# Altium footprint library WIRELESS_SECURITYLib.PcbLib: 35 footprints (part 2 of 3)
Each footprint in its own frame and in the unit in brackets; x right, y up, seen from the top. Pads: shape width x height; smd on the part's side, far side on the other; paste and mask are expansions set on the pad; w line width, h text height; cw(c..) or ccw(c..) is an arc to the next point about the centre after c.
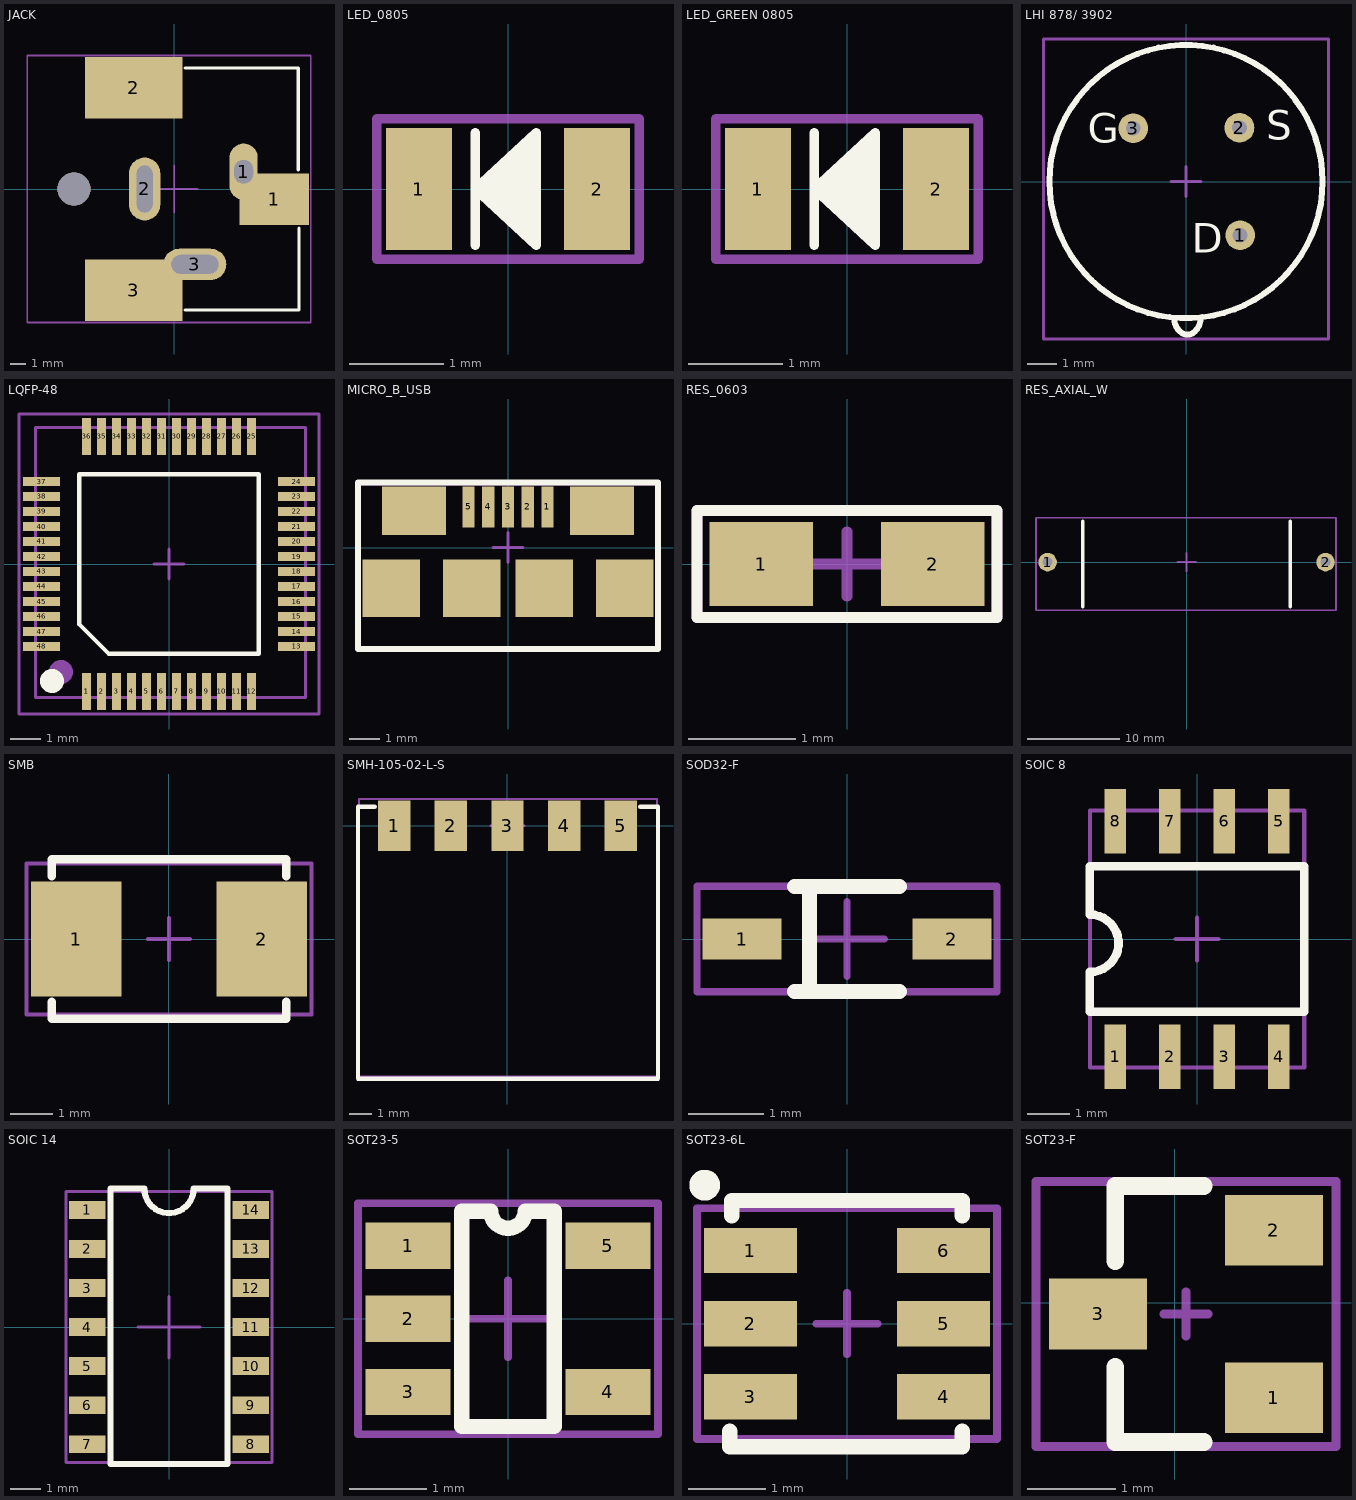
[diagram p1: the footprints below, top view; thin cyan lines are the x and y axes]

## JACK [mm]
pads (7):
  oval 1.8x3.6 hole 1.2 slot 1.5 at 90 deg: 1(4.425,1.1)
  rect 4.4x3.3 smd: 1(6.375,-0.65)
  rect 6.2x3.9 smd: 2(-2.575,6.45) 3(-2.575,-6.45)
  oval 2x4 hole 1 slot 3 at 90 deg: 2(-1.875,0)
  oval 4x2 hole 1.2 slot 3 at 0 deg: 3(1.325,-4.8)
  round 2.1 hole 2.1 unplated: ""(-6.375,0)
Top Overlay:
  lines w0.2: 0.7,-7.7 7.95,-7.7 7.95,-2.5 ; 0.7,7.7 7.9,7.7 7.9,1.2
Top Component Center:
  lines w0.1: -1.5,0 1.5,0 ; 0,-1.5 0,1.5 ; -9.35,-8.5 -9.35,8.5 -5.7,8.5 8.7,8.5 8.7,-8.5 -9.35,-8.5
Top Designator:
  lines w0.1: -9.35,-8.5 8.7,-8.5 8.7,8.5 -5.7,8.5 -9.35,8.5 -9.35,-8.5
  text ".Designator" at -5.35,-1.45 h3
3D body "PJ-037AH-SMT-TR.step": height 11.1, standoff -3.3, extent -9.271,-7.6 7.829,7.6

## LED_0805 [mm]
pads (2):
  rect 0.7x1.3 smd mask+0.05: 1(-0.95,0) 2(0.95,0)
Top Overlay:
  region: -0.35,0 0.25,0.6 0.3,0.6 0.3,-0.6
  lines w0.1: -0.35,-0.6 -0.35,0.6 ; -0.35,0 0.3,-0.6 0.3,0.6 -0.35,0
Top Component Center:
  lines w0.1: -0.25,0 0.25,0 ; 0,-0.25 0,0.25 ; -1.4,-0.75 1.4,-0.75 1.4,0.75 -1.4,0.75 -1.4,-0.75
Top Designator:
  lines w0.1: -1.4,-0.75 1.4,-0.75 1.4,0.75 -1.4,0.75 -1.4,-0.75
  text ".Designator" at -0.55,-0.283 h0.5
3D body "SMD_0805LED_RED.STEP": height 1.1, standoff 0, extent -1.01,-0.625 1.01,0.625

## LED_GREEN 0805 [mm]
pads (2):
  rect 0.7x1.3 smd mask+0.05: 1(-0.95,0) 2(0.95,0)
Top Overlay:
  region: -0.35,0 0.25,0.6 0.3,0.6 0.3,-0.6
  lines w0.1: -0.35,-0.6 -0.35,0.6 ; -0.35,0 0.3,-0.6 0.3,0.6 -0.35,0
Top Component Center:
  lines w0.1: -0.25,0 0.25,0 ; 0,-0.25 0,0.25 ; -1.4,-0.75 1.4,-0.75 1.4,0.75 -1.4,0.75 -1.4,-0.75
Top Designator:
  lines w0.1: -1.4,-0.75 1.4,-0.75 1.4,0.75 -1.4,0.75 -1.4,-0.75
  text ".Designator" at -0.55,-0.283 h0.5
3D body "SMD_0805LED_GREEN.STEP": height 1.17, standoff -0.08, extent -1.01,-0.7 1.01,0.675

## LHI 878/ 3902 [mm]
pads (3):
  round 1 hole 0.5 mask+0.05: 1(1.824,-1.806) 2(1.798,1.811) 3(-1.776,1.794)
Top Overlay:
  circle w0.2: c0,0 r4.6
  lines w0.2: -0.4,-4.6 ccw(c0.204,-4.6) -0.223,-5.027 -0.2,-5.05 ccw(c0.041,-4.809) 0.041,-5.15 0.062,-5.15 ccw(c0.062,-4.818) 0.297,-5.053 ccw(c-0.182,-4.573) 0.496,-4.573
  text "G" at -3.3,1.3 h1
  text "S" at 2.7,1.4 h1
  text "D" at 0.2,-2.4 h1
Top Component Center:
  lines w0.1: -0.5,0 0.5,0 ; 0,-0.5 0,0.5 ; -4.8,-5.3 -4.8,4.8 4.8,4.8 4.8,-5.3 -4.8,-5.3
Top Designator:
  lines w0.1: -4.8,-5.3 -4.8,4.8 4.8,4.8 4.8,-5.3 -4.8,-5.3
  text ".Designator" at -1.85,-0.65 h1.5
3D body "LHI878.step": height 2.05, standoff -4.95, extent -4.6,-5.029 4.6,4.6

## LQFP-48 [mm] "7x7mm"
pads (49):
  rect 0.305x1.219 smd mask+0.05: 1(-2.75,-4.25) 1(-2.75,-4.25) 2(-2.25,-4.25) 3(-1.75,-4.25) 4(-1.25,-4.25) 5(-0.75,-4.25) 6(-0.25,-4.25) 7(0.25,-4.25) 8(0.75,-4.25) 9(1.25,-4.25) 10(1.75,-4.25) 11(2.25,-4.25) 12(2.75,-4.25) 25(2.75,4.25) 26(2.25,4.25) 27(1.75,4.25) 28(1.25,4.25) 29(0.75,4.25) 30(0.25,4.25) 31(-0.25,4.25) 32(-0.75,4.25) 33(-1.25,4.25) 34(-1.75,4.25) 35(-2.25,4.25) 36(-2.75,4.25)
  rect 1.219x0.305 smd mask+0.05: 13(4.25,-2.75) 14(4.25,-2.25) 15(4.25,-1.75) 16(4.25,-1.25) 17(4.25,-0.75) 18(4.25,-0.25) 19(4.25,0.25) 20(4.25,0.75) 21(4.25,1.25) 22(4.25,1.75) 23(4.25,2.25) 24(4.25,2.75) 37(-4.25,2.75) 38(-4.25,2.25) 39(-4.25,1.75) 40(-4.25,1.25) 41(-4.25,0.75) 42(-4.25,0.25) 43(-4.25,-0.25) 44(-4.25,-0.75) 45(-4.25,-1.25) 46(-4.25,-1.75) 47(-4.25,-2.25) 48(-4.25,-2.75)
Top Overlay:
  circle w0.4: c-3.9,-3.9 r0.2
  lines w0.15: -3,-2 -2,-3 3,-3 3,3 -3,3 -3,-2
Top Component Center:
  lines w0.1: -0.5,0 0.5,0 ; 0,-0.5 0,0.5 ; -5,-5 -5,5 -2.7,5 5,5 5,-5 -5,-5
Top Designator:
  circle w0.4: c-3.6,-3.6 r0.2
  lines w0.1: -4.45,-4.45 -4.45,4.55 4.55,4.55 4.55,-4.45 -4.45,-4.45
  text ".Designator" at -2.418,-0.708 h1.52
3D body "STM32-LQFP48.SLDPRT": height 1.5, standoff 0, extent -4.46,-4.46 4.54,4.54

## MICRO_B_USB [mm]
pads (11):
  rect 0.4x1.35 smd mask+0.05: 1(1.3,1.338) 2(0.65,1.338) 3(0,1.338) 4(-0.65,1.338) 5(-1.3,1.338)
  rect 1.9x1.9 smd mask+0.05: ""(-3.85,-1.338) ""(-1.2,-1.338) ""(1.2,-1.338) ""(3.85,-1.338)
  rect 2.1x1.6 smd mask+0.05: ""(-3.1,1.212) ""(3.1,1.212)
Top Overlay:
  lines w0.2: -4.95,-3.35 4.95,-3.35 4.95,2.15 -4.95,2.15 -4.95,-3.35
Top Component Center:
  lines w0.1: -0.5,0 0.5,0 ; 0,-0.5 0,0.5 ; -4.9,-3.3 4.9,-3.3 4.9,2.1 -4.9,2.1 -4.9,-3.3
Top Designator:
  lines w0.1: -4.9,-3.3 -4.9,2.1 4.9,2.1 4.9,-3.3 -4.9,-3.3
  text ".Designator" at -2.45,-1.05 h1.5
3D body "10118192C.stp": height 2.75, standoff -0.26, extent -3.956,-4.061 3.956,1.6

## RES_0603 [mil]
pads (2):
  rect 38x31 smd mask+1.97: 1(-31.5,0) 2(31.5,0)
Top Overlay:
  lines w3.94: -55.12,-19.68 -55.12,-9.6 -55.12,9.6 -55.12,19.68 -26.08,19.68 26.08,19.68 55.12,19.68 55.12,9.6 55.12,-9.6 55.12,-19.68 26.08,-19.68 -26.08,-19.68 -55.12,-19.68
Top Component Center:
  lines w3.94: -11.81,0 11.81,0 ; 0,-11.81 0,11.81 ; 54.13,-19.68 -55.12,-19.68 -55.12,19.68 54.13,19.68 ; 55.12,-19.68 55.12,-9.84 55.12,9.84 55.12,19.68
Top Designator:
  lines w3.94: -55.12,-19.68 55.12,-19.68 55.12,19.68 -55.12,19.68 -55.12,-19.68
  text ".Designator" at -39.37,-9.19 h19.68
3D body "0603S1.STEP": height 17.68, standoff -0.04, extent -39.37,-19.28 38.46,19.28

## RES_AXIAL_W [mm]
pads (2):
  round 2 hole 1.1 mask+0.05: 1(-15,0) 2(15,0)
Top Overlay:
  lines w0.4: -11.2,-4.8 -11.2,4.4 ; 11.2,-4.8 11.2,4.4
Top Component Center:
  lines w0.2: -1,0 1,0 ; 0,-1 0,1 ; -16.256,-5.2 16.129,-5.2 16.129,4.8 -16.256,4.8 -16.256,-5.2
Top Designator:
  lines w0.2: -16.256,-5.2 -16.256,4.8 16.129,4.8 16.129,-5.2 -16.256,-5.2
  text ".Designator" at -6.3,-1 h3
3D body: height 5.02, standoff 4.22, extent 10.451,-0.4 15.451,0.4
3D body: height 5, standoff -4, extent -15.36,-0.4 -14.56,0.4
3D body: height 5, standoff -4, extent 14.701,-0.4 15.501,0.4
3D body: height 9.65, standoff 0, extent -11,-5 11,4.65
3D body: height 5.02, standoff 4.22, extent -15.31,-0.4 -10.31,0.4

## SMB [mm]
pads (2):
  rect 2.159x2.743 smd mask+0.05: 1(-2.21,0) 2(2.21,0)
Top Overlay:
  lines w0.2: -2.8,-1.5 -2.8,-1.9 2.8,-1.9 2.8,-1.5 ; -2.8,1.5 -2.8,1.9 2.8,1.9 2.8,1.5
Top Component Center:
  lines w0.1: -0.5,0 0.5,0 ; 0,-0.5 0,0.5 ; -3.4,-1.8 3.4,-1.8 3.4,1.8 -3.4,1.8 -3.4,-1.8
Top Designator:
  lines w0.1: -3.4,-1.8 -3.4,1.8 3.4,1.8 3.4,-1.8 -3.4,-1.8
  text ".Designator" at -1.55,-0.517 h1
3D body "1SMB5919BT3G.STEP": height 2.44, standoff -0.03, extent -2.72,-1.78 2.72,1.78

## SMH-105-02-L-S [mm]
pads (5):
  rect 1.45x2.25 smd mask+0.05: 1(-5.08,0) 2(-2.54,0) 3(0,0) 4(2.54,0) 5(5.08,0)
Top Overlay:
  lines w0.2: -5.95,0.85 -6.7,0.85 -6.7,-11.35 6.75,-11.35 6.75,0.85 5.95,0.85
Top Component Center:
  lines w0.1: -0.75,0 0.75,0 ; 0,-0.75 0,0.75 ; -6.65,-11.25 -6.65,1.2 6.7,1.2 6.7,-11.25 -6.65,-11.25
Top Designator:
  lines w0.1: -6.65,-11.25 6.7,-11.25 6.7,1.2 -6.65,1.2 -6.65,-11.25
  text ".Designator" at -4.65,-5.634 h2
3D body "SMH-105-02-L-S.stp": height 2.41, standoff -0.01, extent -6.584,-11.209 6.624,0.729

## SOD32-F [mm]
pads (2):
  rect 1.05x0.55 smd mask+0.05: 1(-1.4,0) 2(1.4,0)
Top Overlay:
  lines w0.2: -0.7,-0.7 0.7,-0.7 ; -0.7,0.7 0.7,0.7 ; -0.5,-0.6 -0.5,0.7
Top Component Center:
  lines w0.1: -0.5,0 0.5,0 ; 0,-0.5 0,0.5 ; -2,-0.7 -2,0.7 -0.4,0.7 2,0.7 2,-0.7 -2,-0.7
Top Designator:
  lines w0.1: -2,-0.7 2,-0.7 2,0.7 -0.4,0.7 -2,0.7 -2,-0.7
  text ".Designator" at -1.5,-0.367 h0.7
3D body "User Library-SOD323F-1.step": height 1, standoff 0, extent -1.25,-0.675 1.25,0.675

## SOIC 8 [mm]
pads (8):
  rect 0.5x1.5 smd mask+0.05: 1(-1.905,-2.75) 2(-0.635,-2.75) 3(0.635,-2.75) 4(1.905,-2.75) 5(1.905,2.75) 6(0.635,2.75) 7(-0.635,2.75) 8(-1.905,2.75)
Top Overlay:
  lines w0.2: -2.5,-1.7 -2.5,-0.77 ccw(c-2.5,-0.1) -2.5,0.57 -2.5,1.7 2.5,1.7 2.5,-1.7 -2.5,-1.7
Top Component Center:
  lines w0.1: -0.5,0 0.5,0 ; 0,-0.5 0,0.5 ; -2.5,-3 2.5,-3 2.5,3 -2.5,3 -2.5,-3
Top Designator:
  lines w0.1: -2.5,-3 -2.5,3 2.5,3 2.5,-3 -2.5,-3
  text ".Designator" at 0.35,-1.75 h1.5
3D body "SOIC-8-1.step": height 1.75, standoff 0, extent -2.45,-3 2.45,3

## SOIC 14 [mm]
pads (14):
  rect 1.18x0.58 smd mask+0.05: 1(-2.66,3.81) 2(-2.66,2.54) 3(-2.66,1.27) 4(-2.66,0) 5(-2.66,-1.27) 6(-2.66,-2.54) 7(-2.66,-3.81) 8(2.66,-3.81) 9(2.66,-2.54) 10(2.66,-1.27) 11(2.66,0) 12(2.66,1.27) 13(2.66,2.54) 14(2.66,3.81)
Top Overlay:
  lines w0.2: -1.9,4.45 -1.9,-4.45 1.9,-4.45 1.9,4.5 ; -1.9,4.5 -0.8,4.5 ccw(c0,4.5) 0.8,4.5 1.9,4.5 ; 1.85,4.5 1.9,4.5
Top Component Center:
  lines w0.1: -1,0 1,0 ; 0,-1 0,1 ; -3.35,-4.4 3.35,-4.4 3.35,4.4 -3.35,4.4 -3.35,-4.4
Top Designator:
  lines w0.1: -3.35,-4.4 -3.35,4.4 3.35,4.4 3.35,-4.4 -3.35,-4.4
  text ".Designator" at -2.3,-0.934 h2
3D body "NCS36000DRG.STEP": height 1.73, standoff 0, extent -2.997,-4.343 2.997,4.343

## SOT23-5 [mm]
pads (5):
  rect 1.1x0.6 smd mask+0.05: 1(-1.3,0.95) 2(-1.3,0) 3(-1.3,-0.95) 4(1.3,-0.95) 5(1.3,0.95)
Top Overlay:
  lines w0.2: -0.6,-1.4 0.6,-1.4 0.6,1.4 0.224,1.4 cw(c0,1.4) -0.224,1.4 -0.6,1.4 -0.6,-1.4
Top Component Center:
  lines w0.1: -0.5,0 0.5,0 ; 0,-0.5 0,0.5 ; -1.95,-1.5 -1.95,1.5 1.95,1.5 1.95,-1.5 -1.95,-1.5
Top Designator:
  lines w0.1: -1.95,-1.5 -1.95,1.5 1.95,1.5 1.95,-1.5 -1.95,-1.5
  text ".Designator" at -1.15,-0.467 h1
3D body "OPA314AIDBVR.STEP": height 1.45, standoff 0, extent -1.4,-1.45 1.4,1.45

## SOT23-6L [mm]
pads (6):
  rect 1.21x0.59 smd mask+0.05: 1(-1.255,0.95) 2(-1.255,0) 3(-1.255,-0.95) 4(1.255,-0.95) 5(1.255,0) 6(1.255,0.95)
Top Overlay:
  circle w0.3: c-1.85,1.8 r0.05
  lines w0.2: -1.525,-1.4 -1.525,-1.6 1.5,-1.6 1.5,-1.4 ; -1.5,1.4 -1.5,1.6 1.45,1.6 1.5,1.6 1.5,1.4
Top Component Center:
  lines w0.1: -0.4,0 0.4,0 ; 0,-0.4 0,0.4 ; -1.95,-1.5 1.95,-1.5 1.95,1.5 -1.95,1.5 -1.95,-1.5
Top Designator:
  lines w0.1: -1.95,-1.5 -1.95,1.5 1.95,1.5 1.95,-1.5 -1.95,-1.5
  text ".Designator" at -1.2,-0.417 h1
3D body "USBLC6-2SC6.STEP": height 1.45, standoff 0, extent -1.4,-1.462 1.4,1.462

## SOT23-F [mm]
pads (3):
  rect 1.11x0.8 smd mask+0.05: 1(1.122,-1.077) 2(1.122,0.823) 3(-0.868,-0.127)
Top Overlay:
  lines w0.2: -0.673,-0.727 -0.673,-1.577 0.327,-1.577 ; -0.673,0.473 -0.673,1.323 0.327,1.323
Top Component Center:
  lines w0.1: -0.123,-0.127 0.377,-0.127 ; 0.127,-0.377 0.127,0.123 ; -1.573,-1.627 1.827,-1.627 1.827,1.373 -1.573,1.373 -1.573,-1.627
Top Designator:
  lines w0.1: -1.573,-1.627 -1.573,1.373 1.827,1.373 1.827,-1.627 -1.573,-1.627
  text ".Designator" at 0.36,-1.027 h0.5
3D body "SOT23-3.stp": height 1.2, standoff 0.02, extent -1.291,-1.627 1.545,1.373